# Altium footprint library standard.PcbLib: 330 footprints (part 13 of 21)
Each footprint in its own frame and in the unit in brackets; x right, y up, seen from the top. Pads: shape width x height; smd on the part's side, far side on the other; paste and mask are expansions set on the pad; w line width, h text height; cw(c..) or ccw(c..) is an arc to the next point about the centre after c.
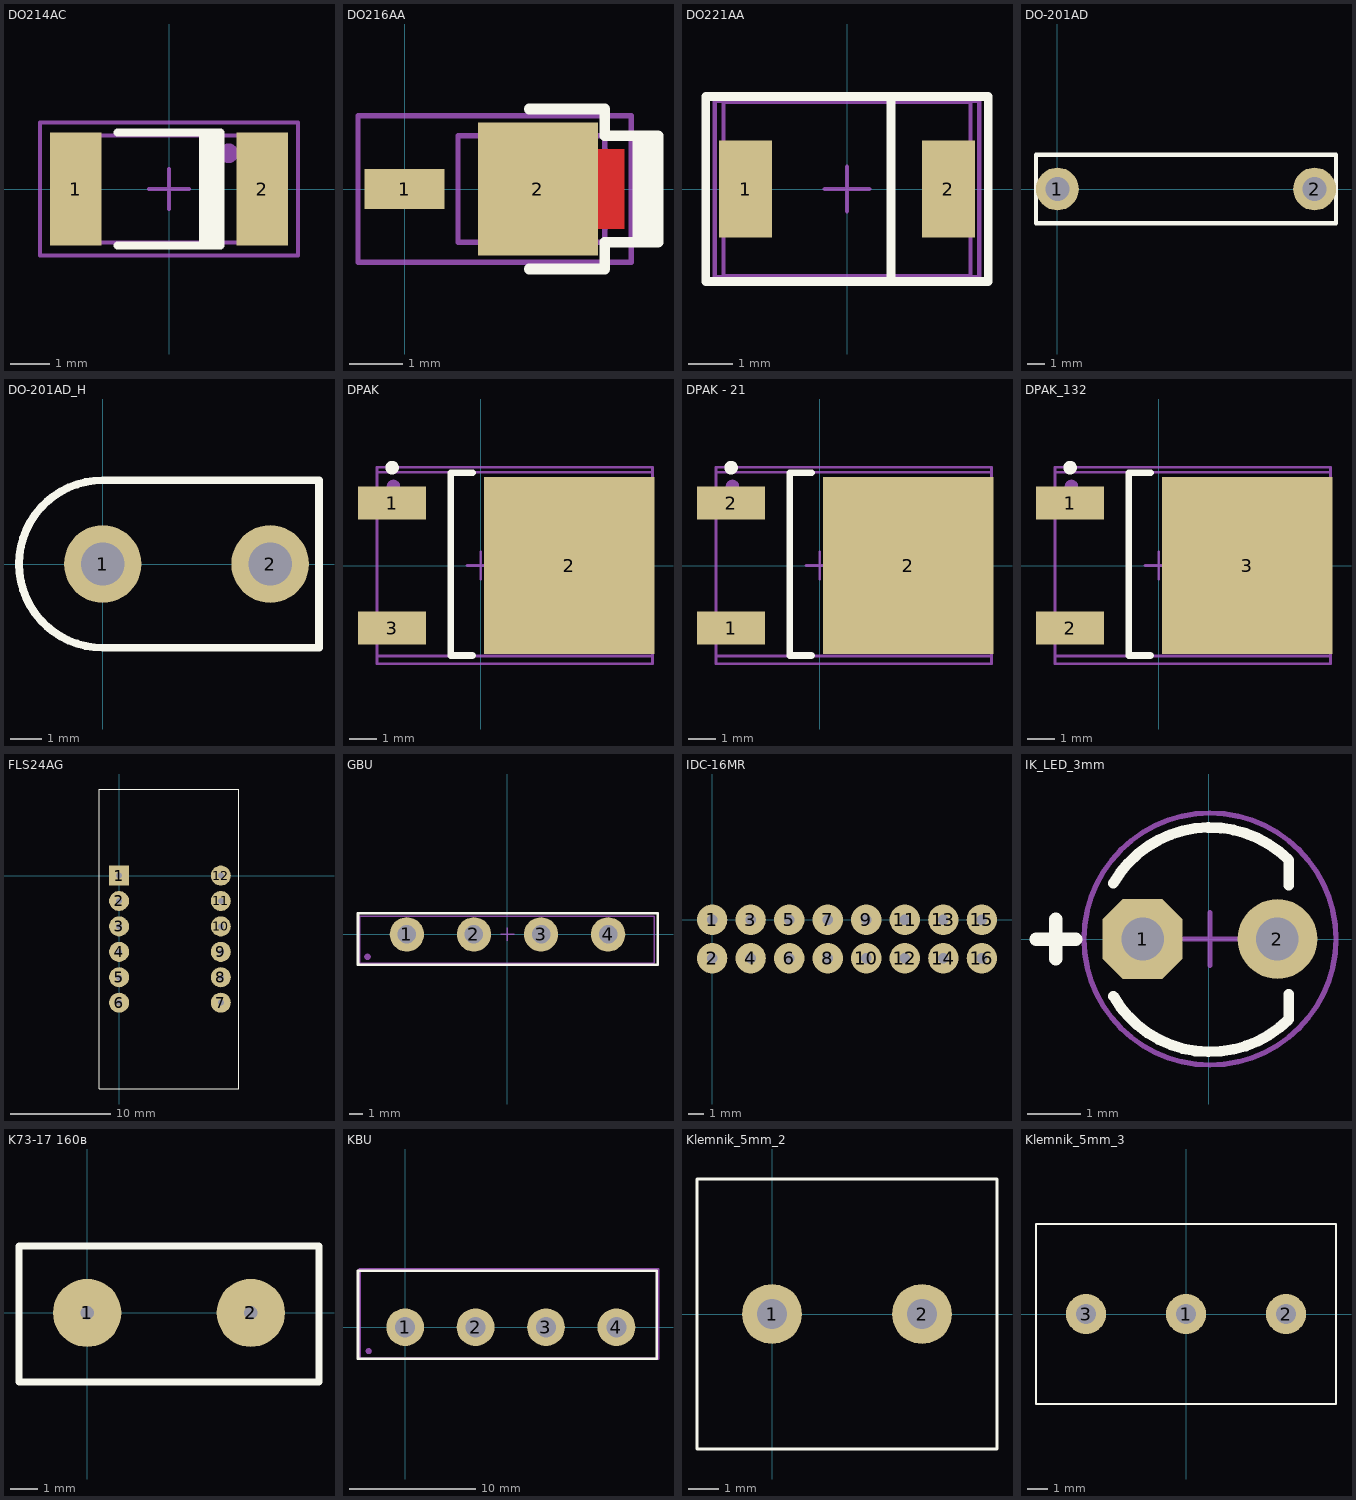
[diagram p12: the footprints below, top view; thin cyan lines are the x and y axes]

## DO214AC [mm] "SMA, MELF Diode, 2-Leads, Body 5,0x2,6mm, IPC Medium Density"
height 2.7
pads (3):
  rect 1.3x2.85 smd: 1(-2.35,0) 2(2.35,0)
  round 0.5 on Mech1: ""(1.5,0.9)
Top Overlay:
  rectangle: 0.75,-1.425 1.3,1.425
  lines w0.2: -1.3,-1.425 1.3,-1.425 1.3,1.425 -1.3,1.425
Mechanical 1:
  rectangle: 1.901,-1.35 2.6,1.35
  lines w0.1: -2.6,-1.35 -2.6,1.35 2.6,1.35 2.6,-1.35 -2.6,-1.35
Mechanical 15:
  lines w0.1: -0.5,0 0.5,0 ; 0,-0.5 0,0.5 ; -3.25,-1.675 -3.25,1.675 3.25,1.675 3.25,-1.675 -3.25,-1.675
3D body "DO-214AC(SMA).step": height 2.24, standoff -0.04, extent -2.743,-1.397 2.743,1.397

## DO216AA [mm] "Schottky Diode, 2-Leads, Body 2x2mm, 0.4W"
height 1
pads (3):
  rect 1.5x0.75 smd: 1(0,0)
  rect 2.25x2.5 smd: 2(2.5,0)
  round 0.5 on Mech1: ""(3.3,0.5)
Top Layer:
  rectangle: 3.625,-0.75 4.125,0.75
Top Overlay:
  rectangle: 4.275,-1 4.75,1
  lines w0.2: 2.337,-1.5 3.75,-1.5 3.75,-1 ; 2.337,1.5 3.75,1.5 3.75,1 ; 3.763,-1 4.725,-1 ; 3.763,1 4.725,1 ; 4.75,-1 4.75,1
Top Solder:
  rectangle: 3.725,-0.85 4.225,0.85
Mechanical 1:
  lines w0.1: 1,-1 1,1 3.75,1 3.75,0.75 4,0.5 4,-0.5 3.75,-0.75 3.75,-1 1,-1
Mechanical 15:
  lines w0.1: 1.85,0 2.85,0 ; 2.35,-0.5 2.35,0.5 ; -0.875,-1.375 4.25,-1.375 4.25,1.375 -0.875,1.375 -0.875,-1.375
3D body "DO216-AA.STEP": height 1.04, standoff 0.02, extent 0,-0.955 3.76,0.955

## DO221AA [mm]
pads (2):
  rect 1.2x2.2 smd: 1(-2.3,0) 2(2.3,0)
Top Overlay:
  lines w0.2: 1,-2.1 1,2.1 ; -3.2,-2.1 -3.2,2.1 3.2,2.1 3.2,-2.1 -3.2,-2.1
Mechanical 13:
  lines w0.1: 1,-1.975 1,1.975 ; -2.8,-1.975 -2.8,1.975 2.8,1.975 2.8,-1.975 -2.8,-1.975
Mechanical 15:
  lines w0.1: -0.5,0 0.5,0 ; 0,-0.5 0,0.5 ; -3,-2 3,-2 3,2 -3,2 -3,-2
3D body "DO-221AA.stp": height 1.1, standoff 0, extent -2.8,-1.975 2.8,1.975

## DO-201AD [mm]
pads (2):
  round 2.5 hole 1.4: 1(0,0) 2(15,0)
Top Overlay:
  lines w0.254: -1.25,-2 -1.25,2 16.25,2 16.25,-2 -1.25,-2

## DO-201AD_H [mm]
pads (2):
  round 2.5 hole 1.4: 1(0,0) 2(5.4,0)
Top Overlay:
  lines w0.254: 6.975,-2.7 6.975,2.7 0,2.7 ccw(c0,0) 0,-2.7 6.975,-2.7 ; 6.975,-2.7 6.975,-2.7

## DPAK [mm] "D-Pak, Body 6,2x6,7mm"
height 2.4
pads (4):
  rect 2.5x1.2 smd: 1(-3.25,2.29) 3(-3.25,-2.29)
  rect 6.25x6.5 smd: 2(3.25,0)
  round 0.5 on Mech1: ""(-3.2,2.9)
Top Overlay:
  circle w0.25: c-3.25,3.59 r0.125
  lines w0.25: -0.3,-3.3 -1.1,-3.3 -1.1,3.4 -0.3,3.4
Mechanical 1:
  lines w0.1: -3.798,-3.317 6.302,-3.317 6.302,3.417 ; -3.798,-3.317 -3.798,-3.317 ; -3.798,-3.317 -3.798,3.417 6.302,3.417 ; 6.302,3.417 6.302,3.417
Mechanical 15:
  lines w0.1: -0.5,0 0.5,0 ; 0,-0.5 0,0.5 ; -3.8,-3.6 -3.8,3.6 6.3,3.6 6.3,-3.6 -3.8,-3.6
3D body "User Library-DPAK_TO-252AA.STEP": height 2.37, standoff -0.03, extent -3.798,-3.317 6.302,3.417

## DPAK - 21 [mm] "D-Pak, Body 6,2x6,7mm"
height 2.4
pads (4):
  rect 2.5x1.2 smd: 1(-3.25,-2.29) 2(-3.25,2.29)
  rect 6.25x6.5 smd: 2(3.25,0)
  round 0.5 on Mech1: ""(-3.2,2.9)
Top Overlay:
  circle w0.25: c-3.25,3.59 r0.125
  lines w0.25: -0.3,-3.3 -1.1,-3.3 -1.1,3.4 -0.3,3.4
Mechanical 1:
  lines w0.1: -3.798,-3.317 6.302,-3.317 6.302,3.417 ; -3.798,-3.317 -3.798,-3.317 ; -3.798,-3.317 -3.798,3.417 6.302,3.417 ; 6.302,3.417 6.302,3.417
Mechanical 15:
  lines w0.1: -0.5,0 0.5,0 ; 0,-0.5 0,0.5 ; -3.8,-3.6 -3.8,3.6 6.3,3.6 6.3,-3.6 -3.8,-3.6
3D body "User Library-DPAK_TO-252AA.STEP": height 2.37, standoff -0.03, extent -3.798,-3.317 6.302,3.417

## DPAK_132 [mm] "D-Pak, Body 6,2x6,7mm"
height 2.4
pads (4):
  rect 2.5x1.2 smd: 1(-3.25,2.29) 2(-3.25,-2.29)
  rect 6.25x6.5 smd: 3(3.25,0)
  round 0.5 on Mech1: ""(-3.2,2.9)
Top Overlay:
  circle w0.25: c-3.25,3.59 r0.125
  lines w0.25: -0.3,-3.3 -1.1,-3.3 -1.1,3.4 -0.3,3.4
Mechanical 1:
  lines w0.1: -3.798,-3.317 -3.798,3.417 6.302,3.417 ; -3.798,-3.317 -3.798,-3.317 ; -3.798,-3.317 6.302,-3.317 6.302,3.417 ; 6.302,3.417 6.302,3.417
Mechanical 15:
  lines w0.1: -0.5,0 0.5,0 ; 0,-0.5 0,0.5 ; -3.8,-3.6 6.3,-3.6 6.3,3.6 -3.8,3.6 -3.8,-3.6
3D body "User Library-DPAK_TO-252AA.STEP": height 2.37, standoff -0.03, extent -3.798,-3.317 6.302,3.417

## FLS24AG [mm]
height 7.5
pads (12):
  rect 2x2 hole 0.6: 1(0,0)
  round 2 hole 0.6: 2(0,-2.54) 3(0,-5.08) 4(0,-7.62) 5(0,-10.16) 6(0,-12.7) 7(10.16,-12.7) 8(10.16,-10.16) 9(10.16,-7.62) 10(10.16,-5.08) 11(10.16,-2.54) 12(10.16,0)
Top Overlay:
  lines w0.1: -2,-21.325 -2,8.65 11.975,8.65 11.975,-21.325 -2,-21.325

## GBU [mm]
pads (5):
  round 2.6 hole 1.4: 1(-7.62,0) 2(-2.54,0) 3(2.54,0) 4(7.62,0)
  round 0.5 on Mech1: 2(-10.6,-1.7)
Top Overlay:
  lines w0.2: -11.32,-2.3 11.38,-2.3 11.38,1.6 -11.32,1.6 -11.32,-2.3
Mechanical 1:
  lines w0.1: -11.17,-2.2 11.13,-2.2 11.13,1.36 -11.17,1.36 -11.17,-2.2
Mechanical 15:
  lines w0.1: -0.5,0 0.5,0 ; 0,-0.5 0,0.5 ; -11.3,-2.3 11.4,-2.3 11.4,1.6 -11.3,1.6 -11.3,-2.3
3D body "User Library-GBU Vishay.STEP": height 25, standoff -11.55, extent -11.17,-2.2 11.13,1.36

## IDC-16MR [mm]
height 10
pads (16):
  round 2 hole 0.7: 1(0,0) 2(0,-2.54) 3(2.54,0) 4(2.54,-2.54) 5(5.08,0) 6(5.08,-2.54) 7(7.62,0) 8(7.62,-2.54) 9(10.16,0) 10(10.16,-2.54) 11(12.7,0) 12(12.7,-2.54) 13(15.24,0) 14(15.24,-2.54) 15(17.78,0) 16(17.78,-2.54)
3D body "IDC-16MR.STEP": height 8.37, standoff -3.43, extent -5.17,-13.55 22.77,0.25

## IK_LED_3mm [mm]
pads (2):
  oct 1.5x1.5 hole 0.8: 1(-1.245,0)
  round 1.5 hole 0.8: 2(1.295,0)
Top Overlay:
  lines w0.2: 1.51,-1.51 cw(c0.025,-0.025) -1.794,-1.075 ccw(c0.025,-0.025) 1.51,-1.51 ; 1.51,-1.51 1.51,-1.04 1.51,-1.51 ; 1.51,1.485 ccw(c0.025,0) -1.794,1.05 cw(c0.025,0) 1.51,1.485 ; 1.51,1.485 1.51,1.015 1.51,1.485
  lines w0.254: -3.25,0 -2.5,0 ; -2.875,-0.375 -2.875,0.375
Mechanical 1:
  circle w0.1: c0.025,0 r2.372
Mechanical 15:
  circle w0.1: c0.025,0 r2.372
  lines w0.1: -0.475,0 0.525,0 ; 0.025,-0.5 0.025,0.5
3D body "IKdiode 3мм.x_t": height 5.3, standoff -6, extent -1.925,-1.947 1.645,1.947

## K73-17 160в [mm]
pads (2):
  round 2.5 hole 0.5: 1(0,0) 2(6,0)
Top Overlay:
  lines w0.254: -2.5,-2.54 -2.5,2.46 8.5,2.46 8.5,-2.54 -2.5,-2.54

## KBU [mm]
pads (5):
  round 3 hole 1.6: 1(0,0) 2(5.6,0) 3(11.2,0) 4(16.8,0)
  round 0.5 on Mech1: 3(-2.9,-1.9)
Top Overlay:
  lines w0.2: -3.75,-2.5 -3.75,4.5 20,4.5 20,-2.5 -3.75,-2.5
Mechanical 1:
  lines w0.2: -3.607,-2.5 -3.607,4.601 20.107,4.601 20.107,-2.5 -3.607,-2.5
Mechanical 15:
  lines w0.1: -3.7,-2.5 20.1,-2.5 20.1,4.6 -3.7,4.6 -3.7,-2.5
3D body "SW3dPS-KBU1010.STEP": height 26.96, standoff -20.74, extent -3.607,-2.5 20.107,4.601

## Klemnik_5mm_2 [mm]
pads (2):
  round 2 hole 1: 1(0,0) 2(5,0)
Top Overlay:
  lines w0.1: -2.5,-4.5 7.5,-4.5 7.5,4.5 -2.5,4.5 -2.5,0 -2.5,-4.5

## Klemnik_5mm_3 [mm]
pads (3):
  round 2 hole 1: 1(0,0) 2(5,0) 3(-5,0)
Top Overlay:
  lines w0.1: -7.5,-4.5 7.5,-4.5 7.5,4.5 -7.5,4.5 -7.5,-4.5